# Altium integrated library GPDSE.IntLib: 634 symbols (part 1 of 7)
Pins are listed as number, name and electrical type; pins without a type are passive.

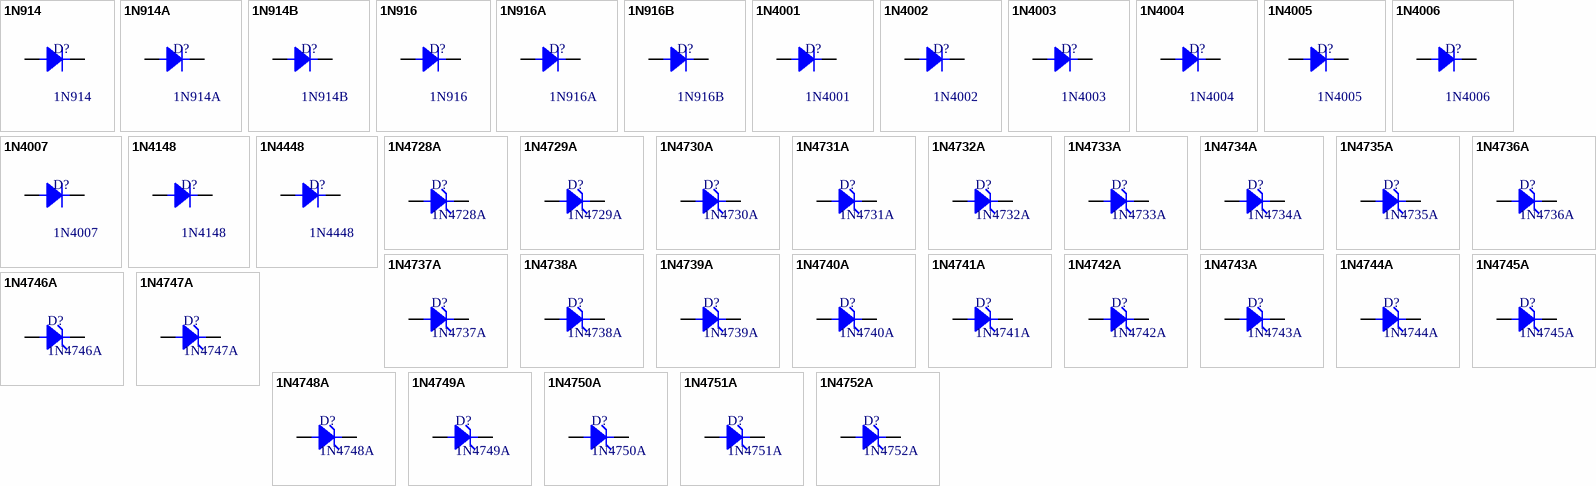
[diagram p0: symbols 1N914 to 1N4752A]

## 1N914
designator D?
Small Signal Diode; Peak Repetitive Reverse Voltage (Vrrm): 100 V; Forward Current (If): 300 mA; Non-Repetitive Peak Forward Surge Current (Ifsm): 1 A; Forward Voltage (Vf): 1 V; Reverse Current (Ir): 25 nA; Total Capacitance (Ct): 4 pF; Max Recovery Time (trr): 4ns
footprint DO-35-Glass (Diode, Axial; Body 3.8 x 1.9 mm (LxDia. max), Lead Dia. 0.53 mm (max), Lead Spacing 7.62 mm)
pins: A, K

## 1N914A
designator D?
Small Signal Diode; Peak Repetitive Reverse Voltage (Vrrm): 100 V; Forward Current (If): 300 mA; Non-Repetitive Peak Forward Surge Current (Ifsm): 1 A; Forward Voltage (Vf): 1 V; Reverse Current (Ir): 25 nA; Total Capacitance (Ct): 4 pF; Max Recovery Time (trr): 4ns
footprint DO-35-Glass (Diode, Axial; Body 3.8 x 1.9 mm (LxDia. max), Lead Dia. 0.53 mm (max), Lead Spacing 7.62 mm)
pins: A, K

## 1N914B
designator D?
Small Signal Diode; Peak Repetitive Reverse Voltage (Vrrm): 100 V; Forward Current (If): 300 mA; Non-Repetitive Peak Forward Surge Current (Ifsm): 1 A; Forward Voltage (Vf): 0.72 V; Reverse Current (Ir): 25 nA; Total Capacitance (Ct): 4 pF; Max Recovery Time (trr): 4ns
footprint DO-35-Glass (Diode, Axial; Body 3.8 x 1.9 mm (LxDia. max), Lead Dia. 0.53 mm (max), Lead Spacing 7.62 mm)
pins: A, K

## 1N916
designator D?
Small Signal Diode; Peak Repetitive Reverse Voltage (Vrrm): 100 V; Forward Current (If): 300 mA; Non-Repetitive Peak Forward Surge Current (Ifsm): 1 A; Forward Voltage (Vf): 1 V; Reverse Current (Ir): 25 nA; Total Capacitance (Ct): 2 pF; Max Recovery Time (trr): 4ns
footprint DO-35-Glass (Diode, Axial; Body 3.8 x 1.9 mm (LxDia. max), Lead Dia. 0.53 mm (max), Lead Spacing 7.62 mm)
pins: A, K

## 1N916A
designator D?
Small Signal Diode; Peak Repetitive Reverse Voltage (Vrrm): 100 V; Forward Current (If): 300 mA; Non-Repetitive Peak Forward Surge Current (Ifsm): 1 A; Forward Voltage (Vf): 1 V; Reverse Current (Ir): 25 nA; Total Capacitance (Ct): 2 pF; Max Recovery Time (trr): 4ns
footprint DO-35-Glass (Diode, Axial; Body 3.8 x 1.9 mm (LxDia. max), Lead Dia. 0.53 mm (max), Lead Spacing 7.62 mm)
pins: A, K

## 1N916B
designator D?
Small Signal Diode; Peak Repetitive Reverse Voltage (Vrrm): 100 V; Forward Current (If): 300 mA; Non-Repetitive Peak Forward Surge Current (Ifsm): 1 A; Forward Voltage (Vf): 0.73 V; Reverse Current (Ir): 25 nA; Total Capacitance (Ct): 2 pF; Max Recovery Time (trr): 4ns
footprint DO-35-Glass (Diode, Axial; Body 3.8 x 1.9 mm (LxDia. max), Lead Dia. 0.53 mm (max), Lead Spacing 7.62 mm)
pins: A, K

## 1N4001
designator D?
General Purpose Rectifier; Peak Repetitive Reverse Voltage (Vrrm): 50 V; Forward Current (If): 1 A; Non-Repetitive Peak Forward Surge Current (Ifsm): 30 A; Forward Voltage (Vf): 1.1 V; Reverse Current (Ir): 5 uA; Total Capacitance (Ct): 15 pF
footprint DO-41-Plastic (Diode, Axial; Body 4.1 x 2.6 mm (LxDia. max), Lead Dia. 1.14 mm (max), Lead Spacing 7.62 mm)
pins: A, K

## 1N4002
designator D?
General Purpose Rectifier; Peak Repetitive Reverse Voltage (Vrrm): 100 V; Forward Current (If): 1 A; Non-Repetitive Peak Forward Surge Current (Ifsm): 30 A; Forward Voltage (Vf): 1.1 V; Reverse Current (Ir): 5 uA; Total Capacitance (Ct): 15 pF
footprint DO-41-Plastic (Diode, Axial; Body 4.1 x 2.6 mm (LxDia. max), Lead Dia. 1.14 mm (max), Lead Spacing 7.62 mm)
pins: A, K

## 1N4003
designator D?
General Purpose Rectifier; Peak Repetitive Reverse Voltage (Vrrm): 200 V; Forward Current (If): 1 A; Non-Repetitive Peak Forward Surge Current (Ifsm): 30 A; Forward Voltage (Vf): 1.1 V; Reverse Current (Ir): 5 uA; Total Capacitance (Ct): 15 pF
footprint DO-41-Plastic (Diode, Axial; Body 4.1 x 2.6 mm (LxDia. max), Lead Dia. 1.14 mm (max), Lead Spacing 7.62 mm)
pins: A, K

## 1N4004
designator D?
General Purpose Rectifier; Peak Repetitive Reverse Voltage (Vrrm): 400 V; Forward Current (If): 1 A; Non-Repetitive Peak Forward Surge Current (Ifsm): 30 A; Forward Voltage (Vf): 1.1 V; Reverse Current (Ir): 5 uA; Total Capacitance (Ct): 15 pF
footprint DO-41-Plastic (Diode, Axial; Body 4.1 x 2.6 mm (LxDia. max), Lead Dia. 1.14 mm (max), Lead Spacing 7.62 mm)
pins: A, K

## 1N4005
designator D?
General Purpose Rectifier; Peak Repetitive Reverse Voltage (Vrrm): 600 V; Forward Current (If): 1 A; Non-Repetitive Peak Forward Surge Current (Ifsm): 30 A; Forward Voltage (Vf): 1.1 V; Reverse Current (Ir): 5 uA; Total Capacitance (Ct): 15 pF
footprint DO-41-Plastic (Diode, Axial; Body 4.1 x 2.6 mm (LxDia. max), Lead Dia. 1.14 mm (max), Lead Spacing 7.62 mm)
pins: A, K

## 1N4006
designator D?
General Purpose Rectifier; Peak Repetitive Reverse Voltage (Vrrm): 800 V; Forward Current (If): 1 A; Non-Repetitive Peak Forward Surge Current (Ifsm): 30 A; Forward Voltage (Vf): 1.1 V; Reverse Current (Ir): 5 uA; Total Capacitance (Ct): 15 pF
footprint DO-41-Plastic (Diode, Axial; Body 4.1 x 2.6 mm (LxDia. max), Lead Dia. 1.14 mm (max), Lead Spacing 7.62 mm)
pins: A, K

## 1N4007
designator D?
General Purpose Rectifier; Peak Repetitive Reverse Voltage (Vrrm): 1000 V; Forward Current (If): 1 A; Non-Repetitive Peak Forward Surge Current (Ifsm): 30 A; Forward Voltage (Vf): 1.1 V; Reverse Current (Ir): 5 uA; Total Capacitance (Ct): 15 pF
footprint DO-41-Plastic (Diode, Axial; Body 4.1 x 2.6 mm (LxDia. max), Lead Dia. 1.14 mm (max), Lead Spacing 7.62 mm)
pins: A, K

## 1N4148
designator D?
Small Signal Diode; Peak Repetitive Reverse Voltage (Vrrm): 100 V; Forward Current (If): 300 mA; Non-Repetitive Peak Forward Surge Current (Ifsm): 1 A; Forward Voltage (Vf): 1 V; Reverse Current (Ir): 25 nA; Total Capacitance (Ct): 4 pF; Max Recovery Time (trr): 4ns
footprint DO-35-Glass (Diode, Axial; Body 3.8 x 1.9 mm (LxDia. max), Lead Dia. 0.53 mm (max), Lead Spacing 7.62 mm)
pins: A, K

## 1N4448
designator D?
Small Signal Diode; Peak Repetitive Reverse Voltage (Vrrm): 100 V; Forward Current (If): 300 mA; Non-Repetitive Peak Forward Surge Current (Ifsm): 1 A; Forward Voltage (Vf): 1 V; Reverse Current (Ir): 25 nA; Total Capacitance (Ct): 2 pF; Max Recovery Time (trr): 4ns
footprint DO-35-Glass (Diode, Axial; Body 3.8 x 1.9 mm (LxDia. max), Lead Dia. 0.53 mm (max), Lead Spacing 7.62 mm)
pins: A, K

## 1N4728A
designator D?
Zener Diode; Zener Voltage (Vz): 3.3 V; Zener Current (Iz): 276 mA; Power Dissipation (Pd): 1.3 W; Forward Voltage (Vf): 1.2 V
footprint DO-41-Glass (Diode, Axial; Body 4.1 x 2.6 mm (LxDia. max), Lead Dia. 1.14 mm (max), Lead Spacing 7.62 mm)
pins: A, K

## 1N4729A
designator D?
Zener Diode; Zener Voltage (Vz): 3.6 V; Zener Current (Iz): 252 mA; Power Dissipation (Pd): 1.3 W; Forward Voltage (Vf): 1.2 V
footprint DO-41-Glass (Diode, Axial; Body 4.1 x 2.6 mm (LxDia. max), Lead Dia. 1.14 mm (max), Lead Spacing 7.62 mm)
pins: A, K

## 1N4730A
designator D?
Zener Diode; Zener Voltage (Vz): 3.9 V; Zener Current (Iz): 234 mA; Power Dissipation (Pd): 1.3 W; Forward Voltage (Vf): 1.2 V
footprint DO-41-Glass (Diode, Axial; Body 4.1 x 2.6 mm (LxDia. max), Lead Dia. 1.14 mm (max), Lead Spacing 7.62 mm)
pins: A, K

## 1N4731A
designator D?
Zener Diode; Zener Voltage (Vz): 4.3 V; Zener Current (Iz): 217 mA; Power Dissipation (Pd): 1.3 W; Forward Voltage (Vf): 1.2 V
footprint DO-41-Glass (Diode, Axial; Body 4.1 x 2.6 mm (LxDia. max), Lead Dia. 1.14 mm (max), Lead Spacing 7.62 mm)
pins: A, K

## 1N4732A
designator D?
Zener Diode; Zener Voltage (Vz): 4.7 V; Zener Current (Iz): 193 mA; Power Dissipation (Pd): 1.3 W; Forward Voltage (Vf): 1.2 V
footprint DO-41-Glass (Diode, Axial; Body 4.1 x 2.6 mm (LxDia. max), Lead Dia. 1.14 mm (max), Lead Spacing 7.62 mm)
pins: A, K

## 1N4733A
designator D?
Zener Diode; Zener Voltage (Vz): 5.1 V; Zener Current (Iz): 178 mA; Power Dissipation (Pd): 1.3 W; Forward Voltage (Vf): 1.2 V
footprint DO-41-Glass (Diode, Axial; Body 4.1 x 2.6 mm (LxDia. max), Lead Dia. 1.14 mm (max), Lead Spacing 7.62 mm)
pins: A, K

## 1N4734A
designator D?
Zener Diode; Zener Voltage (Vz): 5.6 V; Zener Current (Iz): 162 mA; Power Dissipation (Pd): 1.3 W; Forward Voltage (Vf): 1.2 V
footprint DO-41-Glass (Diode, Axial; Body 4.1 x 2.6 mm (LxDia. max), Lead Dia. 1.14 mm (max), Lead Spacing 7.62 mm)
pins: A, K

## 1N4735A
designator D?
Zener Diode; Zener Voltage (Vz): 6.2 V; Zener Current (Iz): 146 mA; Power Dissipation (Pd): 1.3 W; Forward Voltage (Vf): 1.2 V
footprint DO-41-Glass (Diode, Axial; Body 4.1 x 2.6 mm (LxDia. max), Lead Dia. 1.14 mm (max), Lead Spacing 7.62 mm)
pins: A, K

## 1N4736A
designator D?
Zener Diode; Zener Voltage (Vz): 6.8 V; Zener Current (Iz): 133 mA; Power Dissipation (Pd): 1.3 W; Forward Voltage (Vf): 1.2 V
footprint DO-41-Glass (Diode, Axial; Body 4.1 x 2.6 mm (LxDia. max), Lead Dia. 1.14 mm (max), Lead Spacing 7.62 mm)
pins: A, K

## 1N4737A
designator D?
Zener Diode; Zener Voltage (Vz): 7.5 V; Zener Current (Iz): 121 mA; Power Dissipation (Pd): 1.3 W; Forward Voltage (Vf): 1.2 V
footprint DO-41-Glass (Diode, Axial; Body 4.1 x 2.6 mm (LxDia. max), Lead Dia. 1.14 mm (max), Lead Spacing 7.62 mm)
pins: A, K

## 1N4738A
designator D?
Zener Diode; Zener Voltage (Vz): 8.2 V; Zener Current (Iz): 110 mA; Power Dissipation (Pd): 1.3 W; Forward Voltage (Vf): 1.2 V
footprint DO-41-Glass (Diode, Axial; Body 4.1 x 2.6 mm (LxDia. max), Lead Dia. 1.14 mm (max), Lead Spacing 7.62 mm)
pins: A, K

## 1N4739A
designator D?
Zener Diode; Zener Voltage (Vz): 9.1 V; Zener Current (Iz): 100 mA; Power Dissipation (Pd): 1.3 W; Forward Voltage (Vf): 1.2 V
footprint DO-41-Glass (Diode, Axial; Body 4.1 x 2.6 mm (LxDia. max), Lead Dia. 1.14 mm (max), Lead Spacing 7.62 mm)
pins: A, K

## 1N4740A
designator D?
Zener Diode; Zener Voltage (Vz): 10 V; Zener Current (Iz): 91 mA; Power Dissipation (Pd): 1.3 W; Forward Voltage (Vf): 1.2 V
footprint DO-41-Glass (Diode, Axial; Body 4.1 x 2.6 mm (LxDia. max), Lead Dia. 1.14 mm (max), Lead Spacing 7.62 mm)
pins: A, K

## 1N4741A
designator D?
Zener Diode; Zener Voltage (Vz): 11 V; Zener Current (Iz): 83 mA; Power Dissipation (Pd): 1.3 W; Forward Voltage (Vf): 1.2 V
footprint DO-41-Glass (Diode, Axial; Body 4.1 x 2.6 mm (LxDia. max), Lead Dia. 1.14 mm (max), Lead Spacing 7.62 mm)
pins: A, K

## 1N4742A
designator D?
Zener Diode; Zener Voltage (Vz): 12 V; Zener Current (Iz): 76 mA; Power Dissipation (Pd): 1.3 W; Forward Voltage (Vf): 1.2 V
footprint DO-41-Glass (Diode, Axial; Body 4.1 x 2.6 mm (LxDia. max), Lead Dia. 1.14 mm (max), Lead Spacing 7.62 mm)
pins: A, K

## 1N4743A
designator D?
Zener Diode; Zener Voltage (Vz): 13 V; Zener Current (Iz): 69 mA; Power Dissipation (Pd): 1.3 W; Forward Voltage (Vf): 1.2 V
footprint DO-41-Glass (Diode, Axial; Body 4.1 x 2.6 mm (LxDia. max), Lead Dia. 1.14 mm (max), Lead Spacing 7.62 mm)
pins: A, K

## 1N4744A
designator D?
Zener Diode; Zener Voltage (Vz): 15 V; Zener Current (Iz): 61 mA; Power Dissipation (Pd): 1.3 W; Forward Voltage (Vf): 1.2 V
footprint DO-41-Glass (Diode, Axial; Body 4.1 x 2.6 mm (LxDia. max), Lead Dia. 1.14 mm (max), Lead Spacing 7.62 mm)
pins: A, K

## 1N4745A
designator D?
Zener Diode; Zener Voltage (Vz): 16 V; Zener Current (Iz): 57 mA; Power Dissipation (Pd): 1.3 W; Forward Voltage (Vf): 1.2 V
footprint DO-41-Glass (Diode, Axial; Body 4.1 x 2.6 mm (LxDia. max), Lead Dia. 1.14 mm (max), Lead Spacing 7.62 mm)
pins: A, K

## 1N4746A
designator D?
Zener Diode; Zener Voltage (Vz): 18 V; Zener Current (Iz): 50 mA; Power Dissipation (Pd): 1.3 W; Forward Voltage (Vf): 1.2 V
footprint DO-41-Glass (Diode, Axial; Body 4.1 x 2.6 mm (LxDia. max), Lead Dia. 1.14 mm (max), Lead Spacing 7.62 mm)
pins: A, K

## 1N4747A
designator D?
Zener Diode; Zener Voltage (Vz): 20 V; Zener Current (Iz): 45 mA; Power Dissipation (Pd): 1.3 W; Forward Voltage (Vf): 1.2 V
footprint DO-41-Glass (Diode, Axial; Body 4.1 x 2.6 mm (LxDia. max), Lead Dia. 1.14 mm (max), Lead Spacing 7.62 mm)
pins: A, K

## 1N4748A
designator D?
Zener Diode; Zener Voltage (Vz): 22 V; Zener Current (Iz): 41 mA; Power Dissipation (Pd): 1.3 W; Forward Voltage (Vf): 1.2 V
footprint DO-41-Glass (Diode, Axial; Body 4.1 x 2.6 mm (LxDia. max), Lead Dia. 1.14 mm (max), Lead Spacing 7.62 mm)
pins: A, K

## 1N4749A
designator D?
Zener Diode; Zener Voltage (Vz): 24 V; Zener Current (Iz): 38 mA; Power Dissipation (Pd): 1.3 W; Forward Voltage (Vf): 1.2 V
footprint DO-41-Glass (Diode, Axial; Body 4.1 x 2.6 mm (LxDia. max), Lead Dia. 1.14 mm (max), Lead Spacing 7.62 mm)
pins: A, K

## 1N4750A
designator D?
Zener Diode; Zener Voltage (Vz): 27 V; Zener Current (Iz): 34 mA; Power Dissipation (Pd): 1.3 W; Forward Voltage (Vf): 1.2 V
footprint DO-41-Glass (Diode, Axial; Body 4.1 x 2.6 mm (LxDia. max), Lead Dia. 1.14 mm (max), Lead Spacing 7.62 mm)
pins: A, K

## 1N4751A
designator D?
Zener Diode; Zener Voltage (Vz): 30 V; Zener Current (Iz): 30 mA; Power Dissipation (Pd): 1.3 W; Forward Voltage (Vf): 1.2 V
footprint DO-41-Glass (Diode, Axial; Body 4.1 x 2.6 mm (LxDia. max), Lead Dia. 1.14 mm (max), Lead Spacing 7.62 mm)
pins: A, K

## 1N4752A
designator D?
Zener Diode; Zener Voltage (Vz): 33 V; Zener Current (Iz): 27 mA; Power Dissipation (Pd): 1.3 W; Forward Voltage (Vf): 1.2 V
footprint DO-41-Glass (Diode, Axial; Body 4.1 x 2.6 mm (LxDia. max), Lead Dia. 1.14 mm (max), Lead Spacing 7.62 mm)
pins: A, K

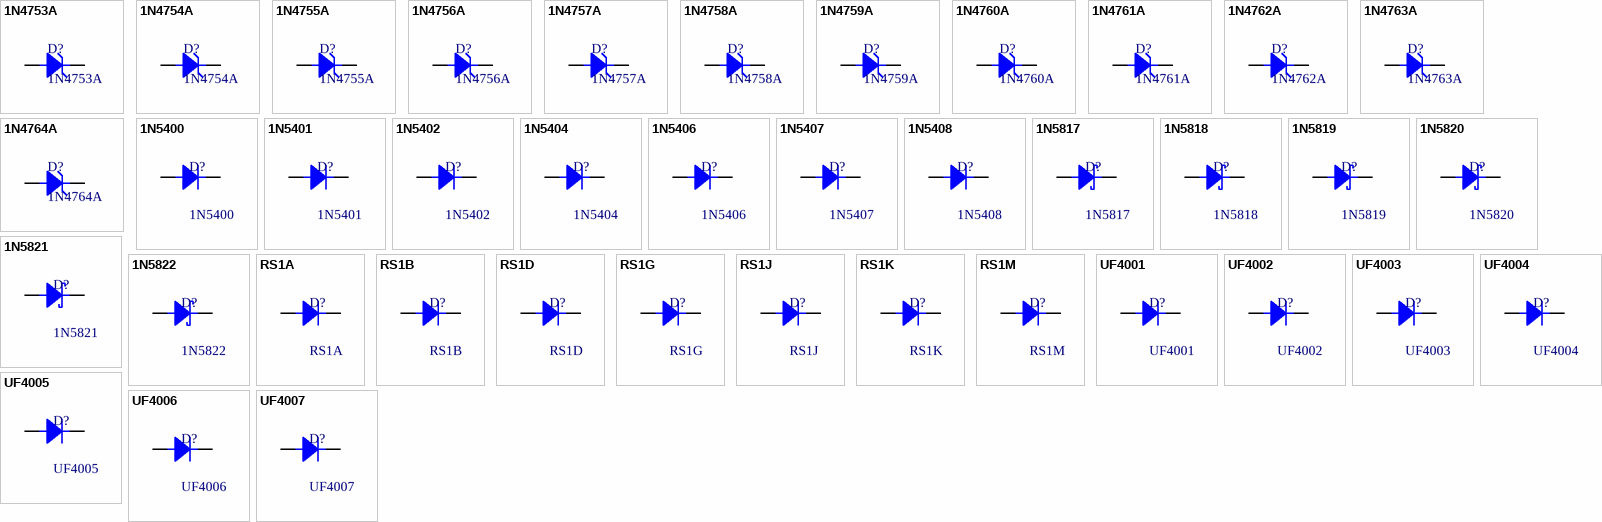
[diagram p1: symbols 1N4753A to UF4007]

## 1N4753A
designator D?
Zener Diode; Zener Voltage (Vz): 36 V; Zener Current (Iz): 25 mA; Power Dissipation (Pd): 1.3 W; Forward Voltage (Vf): 1.2 V
footprint DO-41-Glass (Diode, Axial; Body 4.1 x 2.6 mm (LxDia. max), Lead Dia. 1.14 mm (max), Lead Spacing 7.62 mm)
pins: A, K

## 1N4754A
designator D?
Zener Diode; Zener Voltage (Vz): 39 V; Zener Current (Iz): 23 mA; Power Dissipation (Pd): 1.3 W; Forward Voltage (Vf): 1.2 V
footprint DO-41-Glass (Diode, Axial; Body 4.1 x 2.6 mm (LxDia. max), Lead Dia. 1.14 mm (max), Lead Spacing 7.62 mm)
pins: A, K

## 1N4755A
designator D?
Zener Diode; Zener Voltage (Vz): 43 V; Zener Current (Iz): 22 mA; Power Dissipation (Pd): 1.3 W; Forward Voltage (Vf): 1.2 V
footprint DO-41-Glass (Diode, Axial; Body 4.1 x 2.6 mm (LxDia. max), Lead Dia. 1.14 mm (max), Lead Spacing 7.62 mm)
pins: A, K

## 1N4756A
designator D?
Zener Diode; Zener Voltage (Vz): 47 V; Zener Current (Iz): 19 mA; Power Dissipation (Pd): 1.3 W; Forward Voltage (Vf): 1.2 V
footprint DO-41-Glass (Diode, Axial; Body 4.1 x 2.6 mm (LxDia. max), Lead Dia. 1.14 mm (max), Lead Spacing 7.62 mm)
pins: A, K

## 1N4757A
designator D?
Zener Diode; Zener Voltage (Vz): 51 V; Zener Current (Iz): 18 mA; Power Dissipation (Pd): 1.3 W; Forward Voltage (Vf): 1.2 V
footprint DO-41-Glass (Diode, Axial; Body 4.1 x 2.6 mm (LxDia. max), Lead Dia. 1.14 mm (max), Lead Spacing 7.62 mm)
pins: A, K

## 1N4758A
designator D?
Zener Diode; Zener Voltage (Vz): 56 V; Zener Current (Iz): 16 mA; Power Dissipation (Pd): 1.3 W; Forward Voltage (Vf): 1.2 V
footprint DO-41-Glass (Diode, Axial; Body 4.1 x 2.6 mm (LxDia. max), Lead Dia. 1.14 mm (max), Lead Spacing 7.62 mm)
pins: A, K

## 1N4759A
designator D?
Zener Diode; Zener Voltage (Vz): 62 V; Zener Current (Iz): 14 mA; Power Dissipation (Pd): 1.3 W; Forward Voltage (Vf): 1.2 V
footprint DO-41-Glass (Diode, Axial; Body 4.1 x 2.6 mm (LxDia. max), Lead Dia. 1.14 mm (max), Lead Spacing 7.62 mm)
pins: A, K

## 1N4760A
designator D?
Zener Diode; Zener Voltage (Vz): 68 V; Zener Current (Iz): 13 mA; Power Dissipation (Pd): 1.3 W; Forward Voltage (Vf): 1.2 V
footprint DO-41-Glass (Diode, Axial; Body 4.1 x 2.6 mm (LxDia. max), Lead Dia. 1.14 mm (max), Lead Spacing 7.62 mm)
pins: A, K

## 1N4761A
designator D?
Zener Diode; Zener Voltage (Vz): 75 V; Zener Current (Iz): 12 mA; Power Dissipation (Pd): 1.3 W; Forward Voltage (Vf): 1.2 V
footprint DO-41-Glass (Diode, Axial; Body 4.1 x 2.6 mm (LxDia. max), Lead Dia. 1.14 mm (max), Lead Spacing 7.62 mm)
pins: A, K

## 1N4762A
designator D?
Zener Diode; Zener Voltage (Vz): 82 V; Zener Current (Iz): 11 mA; Power Dissipation (Pd): 1.3 W; Forward Voltage (Vf): 1.2 V
footprint DO-41-Glass (Diode, Axial; Body 4.1 x 2.6 mm (LxDia. max), Lead Dia. 1.14 mm (max), Lead Spacing 7.62 mm)
pins: A, K

## 1N4763A
designator D?
Zener Diode; Zener Voltage (Vz): 91 V; Zener Current (Iz): 10 mA; Power Dissipation (Pd): 1.3 W; Forward Voltage (Vf): 1.2 V
footprint DO-41-Glass (Diode, Axial; Body 4.1 x 2.6 mm (LxDia. max), Lead Dia. 1.14 mm (max), Lead Spacing 7.62 mm)
pins: A, K

## 1N4764A
designator D?
Zener Diode; Zener Voltage (Vz): 100 V; Zener Current (Iz): 9 mA; Power Dissipation (Pd): 1.3 W; Forward Voltage (Vf): 1.2 V
footprint DO-41-Glass (Diode, Axial; Body 4.1 x 2.6 mm (LxDia. max), Lead Dia. 1.14 mm (max), Lead Spacing 7.62 mm)
pins: A, K

## 1N5400
designator D?
3 Amp Rectifier; Forward Current (If): 3 A; Forward Voltage (Vf): 1 V; Non-Repetitive Peak Forward Surge Current (Ifsm): 200 A; Peak Repetitive Reverse Voltage (Vrrm): 50 V; Reverse Current (Ir): 10 uA; Total Capacitance (Ct): 50 pF
footprint DO-201-Plastic (Diode, Axial; Body 9.5 x 5.3 mm (LxDia. max), Lead Dia. 1.30 mm (max), Lead Spacing 15.24 mm)
pins: A, K

## 1N5401
designator D?
3 Amp Rectifier; Forward Current (If): 3 A; Forward Voltage (Vf): 1 V; Non-Repetitive Peak Forward Surge Current (Ifsm): 200 A; Peak Repetitive Reverse Voltage (Vrrm): 100 V; Reverse Current (Ir): 10 uA; Total Capacitance (Ct): 50 pF
footprint DO-201-Plastic (Diode, Axial; Body 9.5 x 5.3 mm (LxDia. max), Lead Dia. 1.30 mm (max), Lead Spacing 15.24 mm)
pins: A, K

## 1N5402
designator D?
3 Amp Rectifier; Forward Current (If): 3 A; Forward Voltage (Vf): 1 V; Non-Repetitive Peak Forward Surge Current (Ifsm): 200 A; Peak Repetitive Reverse Voltage (Vrrm): 200 V; Reverse Current (Ir): 10 uA; Total Capacitance (Ct): 50 pF
footprint DO-201-Plastic (Diode, Axial; Body 9.5 x 5.3 mm (LxDia. max), Lead Dia. 1.30 mm (max), Lead Spacing 15.24 mm)
pins: A, K

## 1N5404
designator D?
3 Amp Rectifier; Forward Current (If): 3 A; Forward Voltage (Vf): 1 V; Non-Repetitive Peak Forward Surge Current (Ifsm): 200 A; Peak Repetitive Reverse Voltage (Vrrm): 400 V; Reverse Current (Ir): 10 uA; Total Capacitance (Ct): 50 pF
footprint DO-201-Plastic (Diode, Axial; Body 9.5 x 5.3 mm (LxDia. max), Lead Dia. 1.30 mm (max), Lead Spacing 15.24 mm)
pins: A, K

## 1N5406
designator D?
3 Amp Rectifier; Forward Current (If): 3 A; Forward Voltage (Vf): 1 V; Non-Repetitive Peak Forward Surge Current (Ifsm): 200 A; Peak Repetitive Reverse Voltage (Vrrm): 600 V; Reverse Current (Ir): 10 uA; Total Capacitance (Ct): 25 pF
footprint DO-201-Plastic (Diode, Axial; Body 9.5 x 5.3 mm (LxDia. max), Lead Dia. 1.30 mm (max), Lead Spacing 15.24 mm)
pins: A, K

## 1N5407
designator D?
3 Amp Rectifier; Forward Current (If): 3 A; Forward Voltage (Vf): 1 V; Non-Repetitive Peak Forward Surge Current (Ifsm): 200 A; Peak Repetitive Reverse Voltage (Vrrm): 800 V; Reverse Current (Ir): 10 uA; Total Capacitance (Ct): 25 pF
footprint DO-201-Plastic (Diode, Axial; Body 9.5 x 5.3 mm (LxDia. max), Lead Dia. 1.30 mm (max), Lead Spacing 15.24 mm)
pins: A, K

## 1N5408
designator D?
3 Amp Rectifier; Forward Current (If): 3 A; Forward Voltage (Vf): 1 V; Non-Repetitive Peak Forward Surge Current (Ifsm): 200 A; Peak Repetitive Reverse Voltage (Vrrm): 1000 V; Reverse Current (Ir): 10 uA; Total Capacitance (Ct): 25 pF
footprint DO-201-Plastic (Diode, Axial; Body 9.5 x 5.3 mm (LxDia. max), Lead Dia. 1.30 mm (max), Lead Spacing 15.24 mm)
pins: A, K

## 1N5817
designator D?
1 Amp Schottky Barrier Rectifier; Forward Current (If): 1 A; Forward Voltage (Vf): 0.55 V; Non-Repetitive Peak Forward Surge Current (Ifsm): 25 A; Peak Repetitive Reverse Voltage (Vrrm): 20 V; Reverse Current (Ir): 1 mA; Total Capacitance (Ct): 110 pF
footprint DO-41-Plastic (Diode, Axial; Body 4.1 x 2.6 mm (LxDia. max), Lead Dia. 1.14 mm (max), Lead Spacing 10.16 mm; 3D Wagner Bernardo)
pins: A, K

## 1N5818
designator D?
1 Amp Schottky Barrier Rectifier; Forward Current (If): 1 A; Forward Voltage (Vf): 0.55 V; Non-Repetitive Peak Forward Surge Current (Ifsm): 25 A; Peak Repetitive Reverse Voltage (Vrrm): 30 V; Reverse Current (Ir): 1 mA; Total Capacitance (Ct): 110 pF
footprint DO-41-Plastic (Diode, Axial; Body 4.1 x 2.6 mm (LxDia. max), Lead Dia. 1.14 mm (max), Lead Spacing 10.16 mm; 3D Wagner Bernardo)
pins: A, K

## 1N5819
designator D?
1 Amp Schottky Barrier Rectifier; Forward Current (If): 1 A; Forward Voltage (Vf): 0.55 V; Non-Repetitive Peak Forward Surge Current (Ifsm): 25 A; Peak Repetitive Reverse Voltage (Vrrm): 40 V; Reverse Current (Ir): 1 mA; Total Capacitance (Ct): 110 pF
footprint DO-41-Plastic (Diode, Axial; Body 4.1 x 2.6 mm (LxDia. max), Lead Dia. 1.14 mm (max), Lead Spacing 10.16 mm; 3D Wagner Bernardo)
pins: A, K

## 1N5820
designator D?
3 Amp Schottky Barrier Rectifier; Forward Current (If): 3 A; Forward Voltage (Vf): 0.5 V; Non-Repetitive Peak Forward Surge Current (Ifsm): 80 A; Peak Repetitive Reverse Voltage (Vrrm): 20 V; Reverse Current (Ir): 2 mA; Total Capacitance (Ct): 110 pF
footprint DO-201-Plastic (Diode, Axial; Body 9.5 x 5.3 mm (LxDia. max), Lead Dia. 1.30 mm (max), Lead Spacing 15.24 mm; 3D Wagner Bernardo)
pins: A, K

## 1N5821
designator D?
3 Amp Schottky Barrier Rectifier; Forward Current (If): 3 A; Forward Voltage (Vf): 0.5 V; Non-Repetitive Peak Forward Surge Current (Ifsm): 80 A; Peak Repetitive Reverse Voltage (Vrrm): 30 V; Reverse Current (Ir): 2 mA; Total Capacitance (Ct): 110 pF
footprint DO-201-Plastic (Diode, Axial; Body 9.5 x 5.3 mm (LxDia. max), Lead Dia. 1.30 mm (max), Lead Spacing 15.24 mm; 3D Wagner Bernardo)
pins: A, K

## 1N5822
designator D?
3 Amp Schottky Barrier Rectifier; Forward Current (If): 3 A; Forward Voltage (Vf): 0.5 V; Non-Repetitive Peak Forward Surge Current (Ifsm): 80 A; Peak Repetitive Reverse Voltage (Vrrm): 40 V; Reverse Current (Ir): 2 mA; Total Capacitance (Ct): 110 pF
footprint DO-201-Plastic (Diode, Axial; Body 9.5 x 5.3 mm (LxDia. max), Lead Dia. 1.30 mm (max), Lead Spacing 15.24 mm; 3D Wagner Bernardo)
pins: A, K

## RS1A
designator D?
1 A Fast Rectifier; Forward Current (If): 1 A; Forward Voltage (Vf): 1.3 V; Max Recovery Time (trr): 150ns; Non-Repetitive Peak Forward Surge Current (Ifsm): 30 A; Peak Repetitive Reverse Voltage (Vrrm): 50 V; Reverse Current (Ir): 50 uA; Total Capacitance (Ct): 10 pF
footprint DO-214AC (DO-214AC, 3D: Leszek Madej)
pins: A, K

## RS1B
designator D?
1 A Fast Rectifier; Forward Current (If): 1 A; Forward Voltage (Vf): 1.3 V; Max Recovery Time (trr): 150ns; Non-Repetitive Peak Forward Surge Current (Ifsm): 30 A; Peak Repetitive Reverse Voltage (Vrrm): 100 V; Reverse Current (Ir): 50 uA; Total Capacitance (Ct): 10 pF
footprint DO-214AC (DO-214AC, 3D: Leszek Madej)
pins: A, K

## RS1D
designator D?
1 A Fast Rectifier; Forward Current (If): 1 A; Forward Voltage (Vf): 1.3 V; Max Recovery Time (trr): 150ns; Non-Repetitive Peak Forward Surge Current (Ifsm): 30 A; Peak Repetitive Reverse Voltage (Vrrm): 200 V; Reverse Current (Ir): 50 uA; Total Capacitance (Ct): 10 pF
footprint DO-214AC (DO-214AC, 3D: Leszek Madej)
pins: A, K

## RS1G
designator D?
1 A Fast Rectifier; Forward Current (If): 1 A; Forward Voltage (Vf): 1.3 V; Max Recovery Time (trr): 150ns; Non-Repetitive Peak Forward Surge Current (Ifsm): 30 A; Peak Repetitive Reverse Voltage (Vrrm): 400 V; Reverse Current (Ir): 50 uA; Total Capacitance (Ct): 10 pF
footprint DO-214AC (DO-214AC, 3D: Leszek Madej)
pins: A, K

## RS1J
designator D?
1 A Fast Rectifier; Forward Current (If): 1 A; Forward Voltage (Vf): 1.3 V; Max Recovery Time (trr): 250ns; Non-Repetitive Peak Forward Surge Current (Ifsm): 30 A; Peak Repetitive Reverse Voltage (Vrrm): 600 V; Reverse Current (Ir): 50 uA; Total Capacitance (Ct): 10 pF
footprint DO-214AC (DO-214AC, 3D: Leszek Madej)
pins: A, K

## RS1K
designator D?
1 A Fast Rectifier; Forward Current (If): 1 A; Forward Voltage (Vf): 1.3 V; Max Recovery Time (trr): 500ns; Non-Repetitive Peak Forward Surge Current (Ifsm): 30 A; Peak Repetitive Reverse Voltage (Vrrm): 800 V; Reverse Current (Ir): 50 uA; Total Capacitance (Ct): 10 pF
footprint DO-214AC (DO-214AC, 3D: Leszek Madej)
pins: A, K

## RS1M
designator D?
1 A Fast Rectifier; Forward Current (If): 1 A; Forward Voltage (Vf): 1.3 V; Max Recovery Time (trr): 500ns; Non-Repetitive Peak Forward Surge Current (Ifsm): 30 A; Peak Repetitive Reverse Voltage (Vrrm): 1000 V; Reverse Current (Ir): 50 uA; Total Capacitance (Ct): 10 pF
footprint DO-214AC (DO-214AC, 3D: Leszek Madej)
pins: A, K

## UF4001
designator D?
Ultrafast Plastic Rectifier; Peak Repetitive Reverse Voltage (Vrrm): 50 V; Forward Current (If): 1 A; Non-Repetitive Peak Forward Surge Current (Ifsm): 30 A; Forward Voltage (Vf): 1 V; Reverse Current (Ir): 10 uA; Total Capacitance (Ct): 17 pF; Max Recovery Time (trr): 50ns
footprint DO-41-Plastic (Diode, Axial; Body 4.1 x 2.6 mm (LxDia. max), Lead Dia. 1.14 mm (max), Lead Spacing 7.62 mm)
pins: A, K

## UF4002
designator D?
Ultrafast Plastic Rectifier; Peak Repetitive Reverse Voltage (Vrrm): 100 V; Forward Current (If): 1 A; Non-Repetitive Peak Forward Surge Current (Ifsm): 30 A; Forward Voltage (Vf): 1 V; Reverse Current (Ir): 10 uA; Total Capacitance (Ct): 17 pF; Max Recovery Time (trr): 50ns
footprint DO-41-Plastic (Diode, Axial; Body 4.1 x 2.6 mm (LxDia. max), Lead Dia. 1.14 mm (max), Lead Spacing 7.62 mm)
pins: A, K

## UF4003
designator D?
Ultrafast Plastic Rectifier; Peak Repetitive Reverse Voltage (Vrrm): 200 V; Forward Current (If): 1 A; Non-Repetitive Peak Forward Surge Current (Ifsm): 30 A; Forward Voltage (Vf): 1 V; Reverse Current (Ir): 10 uA; Total Capacitance (Ct): 17 pF; Max Recovery Time (trr): 50ns
footprint DO-41-Plastic (Diode, Axial; Body 4.1 x 2.6 mm (LxDia. max), Lead Dia. 1.14 mm (max), Lead Spacing 7.62 mm)
pins: A, K

## UF4004
designator D?
Ultrafast Plastic Rectifier; Peak Repetitive Reverse Voltage (Vrrm): 400 V; Forward Current (If): 1 A; Non-Repetitive Peak Forward Surge Current (Ifsm): 30 A; Forward Voltage (Vf): 1 V; Reverse Current (Ir): 10 uA; Total Capacitance (Ct): 17 pF; Max Recovery Time (trr): 50ns
footprint DO-41-Plastic (Diode, Axial; Body 4.1 x 2.6 mm (LxDia. max), Lead Dia. 1.14 mm (max), Lead Spacing 7.62 mm)
pins: A, K

## UF4005
designator D?
Ultrafast Plastic Rectifier; Peak Repetitive Reverse Voltage (Vrrm): 600 V; Forward Current (If): 1 A; Non-Repetitive Peak Forward Surge Current (Ifsm): 30 A; Forward Voltage (Vf): 1.7 V; Reverse Current (Ir): 10 uA; Total Capacitance (Ct): 17 pF; Max Recovery Time (trr): 74ns
footprint DO-41-Plastic (Diode, Axial; Body 4.1 x 2.6 mm (LxDia. max), Lead Dia. 1.14 mm (max), Lead Spacing 7.62 mm)
pins: A, K

## UF4006
designator D?
Ultrafast Plastic Rectifier; Peak Repetitive Reverse Voltage (Vrrm): 800 V; Forward Current (If): 1 A; Non-Repetitive Peak Forward Surge Current (Ifsm): 30 A; Forward Voltage (Vf): 1.7 V; Reverse Current (Ir): 10 uA; Total Capacitance (Ct): 17 pF; Max Recovery Time (trr): 75ns
footprint DO-41-Plastic (Diode, Axial; Body 4.1 x 2.6 mm (LxDia. max), Lead Dia. 1.14 mm (max), Lead Spacing 7.62 mm)
pins: A, K

## UF4007
designator D?
Ultrafast Plastic Rectifier; Peak Repetitive Reverse Voltage (Vrrm): 1000 V; Forward Current (If): 1 A; Non-Repetitive Peak Forward Surge Current (Ifsm): 30 A; Forward Voltage (Vf): 1.7 V; Reverse Current (Ir): 10 uA; Total Capacitance (Ct): 17 pF; Max Recovery Time (trr): 75ns
footprint DO-41-Plastic (Diode, Axial; Body 4.1 x 2.6 mm (LxDia. max), Lead Dia. 1.14 mm (max), Lead Spacing 7.62 mm)
pins: A, K

